# Altium footprint library PrISUm-ICs.PcbLib: 42 footprints (part 1 of 3)
Each footprint in its own frame and in the unit in brackets; x right, y up, seen from the top. Pads: shape width x height; smd on the part's side, far side on the other; paste and mask are expansions set on the pad; w line width, h text height; cw(c..) or ccw(c..) is an arc to the next point about the centre after c.
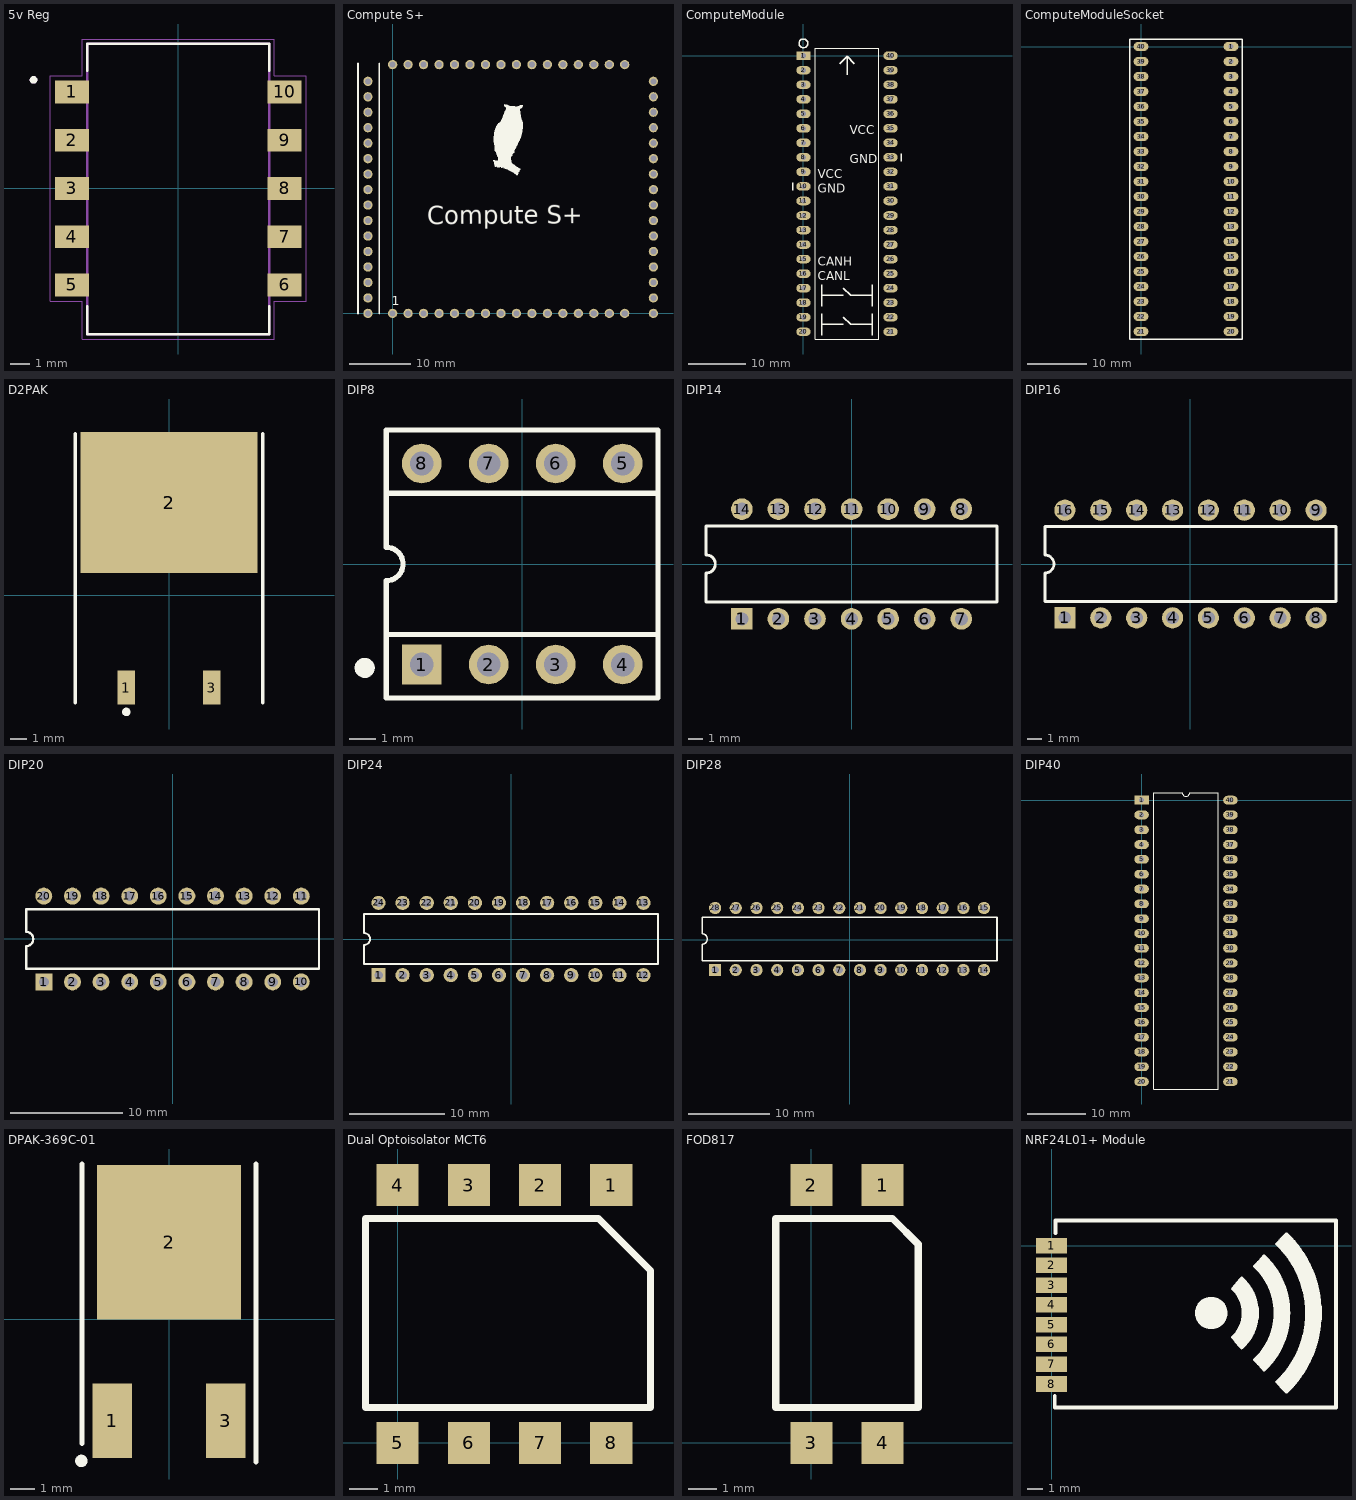
[diagram p0: the footprints below, top view; thin cyan lines are the x and y axes]

## 5v Reg [mm]
pads (10):
  rect 1.8x1.2 smd: 1(-5.6,5.08) 2(-5.6,2.54) 3(-5.6,0) 4(-5.6,-2.54) 5(-5.6,-5.08) 6(5.6,-5.08) 7(5.6,-2.54) 8(5.6,0) 9(5.6,2.54) 10(5.6,5.08)
Top Overlay:
  circle w0.2: c-7.62,5.715 r0.1
  lines w0.127: -4.8,-6.2 -4.8,-7.68 4.8,-7.68 4.8,-6.2 ; -4.8,6.2 -4.8,7.62 4.8,7.62 4.8,6.2
Mechanical 13:
  circle w0.2: c-7.62,5.715 r0.1
  lines w0.127: -4.8,-7.68 4.8,-7.68 4.8,7.62 -4.8,7.62 -4.8,-7.68
Mechanical 15:
  lines w0.05: -6.75,-5.93 -5.05,-5.93 -5.05,-7.93 5.05,-7.93 5.05,-5.93 6.75,-5.93 6.75,5.93 5.05,5.93 5.05,7.87 -5.05,7.87 -5.05,5.93 -6.75,5.93 -6.75,-5.93

## Compute S+ [mil]
height 346.46
pads (64):
  round 60 hole 39.37: CANH(1000,1607.95) CANL(1100,1607.95) GND(-160,900) GND(100,1607.95) GND(600,0) GND(900,1607.95) GND(1685,600) GND(1685,1400) PA00(-160,1500) PA01(-160,1400) PA02(-160,1300) PA03(-160,1200) PA04(-160,300) PA05(-160,200) PA06(-160,100) PA07(-160,0) PA08(0,0) PA09(100,0) PA10(200,0) PA11(300,0) PA12(1200,0) PA13(1300,0) PA14(1400,0) PA15(1500,0) PA16(1685,0) PA17(1685,100) PA18(1685,200) PA19(1685,300) PA20(1685,800) PA21(1685,900) PA22(1685,1000) PA23(1685,1100) PA24(1685,1200) PA25(1685,1300) PA27(1500,1607.95) PA28(1400,1607.95) PA30(1300,1607.95) PA31(1200,1607.95) PB00(500,1607.95) PB01(400,1607.95) PB02(300,1607.95) PB03(200,1607.95) PB04(-160,1100) PB05(-160,1000) PB06(-160,700) PB07(-160,600) PB08(-160,500) PB09(-160,400) PB10(400,0) PB11(500,0) PB12(800,0) PB13(900,0) PB14(1000,0) PB15(1100,0) PB16(1685,400) PB17(1685,500) PB30(700,1607.95) PB31(600,1607.95) VDD(-160,800) VDD(0,1607.95) VDD(700,0) VDD(800,1607.95) VDD(1685,700) VDD(1685,1500)
Top Overlay:
  drawing of 3 lines, arcs and shapes, not listed
  text "1" at -7.09,51.57 h60
  text "Compute S+" at 222.44,538.19 h196.85
3D body "V2_SP.step": height 549.33, standoff 19.68, extent -261.2,-83.86 1773.8,1726.14

## ComputeModule [mm] "Socket for compute module"
pads (40):
  rect 2.5x1.5 / inner rect 2.5x0.9 / far side rect 2.5x1.5 hole 0.9: 1(0,0)
  oval 2.5x1.5 / inner oval 2.5x0.9 / far side oval 2.5x1.5 hole 0.9: 2(0,-2.54) 3(0,-5.08) 4(0,-7.62) 5(0,-10.16) 6(0,-12.7) 7(0,-15.24) 8(0,-17.78) 9(0,-20.32) 10(0,-22.86) 11(0,-25.4) 12(0,-27.94) 13(0,-30.48) 14(0,-33.02) 15(0,-35.56) 16(0,-38.1) 17(0,-40.64) 18(0,-43.18) 19(0,-45.72) 20(0,-48.26) 21(15.24,-48.26) 22(15.24,-45.72) 23(15.24,-43.18) 24(15.24,-40.64) 25(15.24,-38.1) 26(15.24,-35.56) 27(15.24,-33.02) 28(15.24,-30.48) 29(15.24,-27.94) 30(15.24,-25.4) 31(15.24,-22.86) 32(15.24,-20.32) 33(15.24,-17.78) 34(15.24,-15.24) 35(15.24,-12.7) 36(15.24,-10.16) 37(15.24,-7.62) 38(15.24,-5.08) 39(15.24,-2.54) 40(15.24,0)
Top Overlay:
  circle w0.254: c0,2.159 r0.762
  lines w0.2: 2.085,-49.53 2.085,1.27 6.985,1.27 13.155,1.27 13.155,-49.53 2.085,-49.53
  lines w0.254: -1.905,-23.495 -1.905,-22.225 ; 3.175,-48.895 3.175,-45.085 ; 3.175,-46.99 6.35,-46.99 6.985,-46.99 ; 3.175,-43.815 3.175,-40.005 ; 3.175,-41.91 6.35,-41.91 6.985,-41.91 ; 6.35,-1.397 7.62,-0.127 ; 6.985,-45.72 8.255,-46.99 8.89,-46.99 12.065,-46.99 ; 6.985,-40.64 8.255,-41.91 8.89,-41.91 12.065,-41.91 ; 7.62,-3.302 7.62,-0.127 ; 8.89,-1.397 7.62,-0.127 ; 12.065,-48.895 12.065,-45.085 ; 12.065,-43.815 12.065,-40.005 ; 17.145,-18.415 17.145,-17.145
  text "CANH" at 2.54,-36.703 h1.52
  text "CANL" at 2.54,-39.243 h1.52
  text "GND" at 8.128,-18.796 h1.52
  text "VCC" at 8.128,-13.716 h1.52
  text "GND" at 2.54,-24.003 h1.52
  text "VCC" at 2.54,-21.463 h1.52
3D body "ComputeModule.step": height 17.95, standoff 2, extent -1.905,-49.53 17.145,9.961
3D body "Header Female 1x10.STEP": height 8.29, standoff -3.59, extent 14.035,-49.53 16.51,-23.53
3D body "Header Female 1x10.STEP": height 8.29, standoff -3.59, extent 14.035,-24.13 16.51,1.87
3D body "Header Female 1x10.STEP": height 8.29, standoff -3.59, extent -1.205,-49.53 1.27,-23.53
3D body "Header Female 1x10.STEP": height 8.29, standoff -3.59, extent -1.205,-24.13 1.27,1.87

## ComputeModuleSocket [mm] "Socket for compute module"
pads (40):
  oval 2.5x1.5 / inner oval 2.5x0.9 / far side oval 2.5x1.5 hole 0.9: 1(15.24,0) 2(15.24,-2.54) 3(15.24,-5.08) 4(15.24,-7.62) 5(15.24,-10.16) 6(15.24,-12.7) 7(15.24,-15.24) 8(15.24,-17.78) 9(15.24,-20.32) 10(15.24,-22.86) 11(15.24,-25.4) 12(15.24,-27.94) 13(15.24,-30.48) 14(15.24,-33.02) 15(15.24,-35.56) 16(15.24,-38.1) 17(15.24,-40.64) 18(15.24,-43.18) 19(15.24,-45.72) 20(15.24,-48.26) 21(0,-48.26) 22(0,-45.72) 23(0,-43.18) 24(0,-40.64) 25(0,-38.1) 26(0,-35.56) 27(0,-33.02) 28(0,-30.48) 29(0,-27.94) 30(0,-25.4) 31(0,-22.86) 32(0,-20.32) 33(0,-17.78) 34(0,-15.24) 35(0,-12.7) 36(0,-10.16) 37(0,-7.62) 38(0,-5.08) 39(0,-2.54) 40(0,0)
Top Overlay:
  lines w0.254: -1.905,-49.53 17.145,-49.53 17.145,1.27 2.085,1.27 -1.905,1.27 -1.905,-49.53
3D body "Pin Header 1x5 TH Pitch 2.54mm.stp": height 1.7, standoff -11, extent -1.27,-11.43 1.27,1.27
3D body "Pin Header 1x5 TH Pitch 2.54mm.stp": height 1.7, standoff -11, extent -1.27,-24.13 1.27,-11.43
3D body "Pin Header 1x5 TH Pitch 2.54mm.stp": height 1.7, standoff -11, extent -1.27,-36.83 1.27,-24.13
3D body "Pin Header 1x5 TH Pitch 2.54mm.stp": height 1.7, standoff -11, extent -1.27,-49.53 1.27,-36.83
3D body "Pin Header 1x5 TH Pitch 2.54mm.stp": height 1.7, standoff -11, extent 13.97,-36.83 16.51,-24.13
3D body "Pin Header 1x5 TH Pitch 2.54mm.stp": height 1.7, standoff -11, extent 13.97,-49.53 16.51,-36.83
3D body "Pin Header 1x5 TH Pitch 2.54mm.stp": height 1.7, standoff -11, extent 13.97,-24.13 16.51,-11.43
3D body "Pin Header 1x5 TH Pitch 2.54mm.stp": height 1.7, standoff -11, extent 13.97,-11.43 16.51,1.27

## D2PAK [mm]
pads (3):
  rect 1.05x2 smd: 1(-2.54,-5.5) 3(2.54,-5.5)
  rect 10.55x8.4 smd: 2(0,5.5)
Top Overlay:
  circle w0.25: c-2.54,-6.95 r0.125
  lines w0.2: -5.575,-6.4 -5.575,9.6 ; 5.575,-6.4 5.575,9.6

## DIP8 [mm]
pads (8):
  rect 1.5x1.5 hole 0.9: 1(-3.81,-3.81)
  round 1.5 hole 0.9: 2(-1.27,-3.81) 3(1.27,-3.81) 4(3.81,-3.81) 5(3.81,3.81) 6(1.27,3.81) 7(-1.27,3.81) 8(-3.81,3.81)
Top Overlay:
  circle w0.254: c-6.096,-3.937 r0.127
  circle w0.254: c-5.969,-3.937 r0.254
  lines w0.2: -5.15,-2.67 5.125,-2.67 ; -5.15,2.68 5.15,2.68 ; -5.15,-5.08 5.15,-5.08 5.15,5.08 -5.15,5.08 -5.15,0.635 cw(c-5.15,0) -5.15,-0.635 -5.15,-5.08
3D body "DIP8.STEP": height 3.85, standoff -2, extent -4.6,-3.935 4.6,3.935

## DIP14 [mm]
pads (14):
  rect 1.5x1.5 hole 0.9: 1(-7.62,-3.81)
  round 1.5 hole 0.9: 2(-5.08,-3.81) 3(-2.54,-3.81) 4(0,-3.81) 5(2.54,-3.81) 6(5.08,-3.81) 7(7.62,-3.81) 8(7.62,3.81) 9(5.08,3.81) 10(2.54,3.81) 11(0,3.81) 12(-2.54,3.81) 13(-5.08,3.81) 14(-7.62,3.81)
Top Overlay:
  lines w0.2: -10.1,-2.65 10.1,-2.65 10.1,2.65 -10.1,2.65 -10.1,0.635 cw(c-10.1,0) -10.1,-0.635 -10.1,-2.65

## DIP16 [mm]
pads (16):
  rect 1.5x1.5 hole 0.9: 1(-8.89,-3.81)
  round 1.5 hole 0.9: 2(-6.35,-3.81) 3(-3.81,-3.81) 4(-1.27,-3.81) 5(1.27,-3.81) 6(3.81,-3.81) 7(6.35,-3.81) 8(8.89,-3.81) 9(8.89,3.81) 10(6.35,3.81) 11(3.81,3.81) 12(1.27,3.81) 13(-1.27,3.81) 14(-3.81,3.81) 15(-6.35,3.81) 16(-8.89,3.81)
Top Overlay:
  lines w0.2: -10.3,-2.65 -10.3,-0.635 ccw(c-10.3,0) -10.3,0.635 -10.3,2.65 10.3,2.65 10.3,-2.65 -10.3,-2.65

## DIP20 [mm]
pads (20):
  rect 1.5x1.5 hole 0.9: 1(-11.43,-3.81)
  round 1.5 hole 0.9: 2(-8.89,-3.81) 3(-6.35,-3.81) 4(-3.81,-3.81) 5(-1.27,-3.81) 6(1.27,-3.81) 7(3.81,-3.81) 8(6.35,-3.81) 9(8.89,-3.81) 10(11.43,-3.81) 11(11.43,3.81) 12(8.89,3.81) 13(6.35,3.81) 14(3.81,3.81) 15(1.27,3.81) 16(-1.27,3.81) 17(-3.81,3.81) 18(-6.35,3.81) 19(-8.89,3.81) 20(-11.43,3.81)
Top Overlay:
  lines w0.2: -13,-2.65 -13,-0.635 ccw(c-13,0) -13,0.635 -13,2.65 13,2.65 13,-2.65 -13,-2.65

## DIP24 [mm]
pads (24):
  rect 1.5x1.5 hole 0.9: 1(-13.97,-3.81)
  round 1.5 hole 0.9: 2(-11.43,-3.81) 3(-8.89,-3.81) 4(-6.35,-3.81) 5(-3.81,-3.81) 6(-1.27,-3.81) 7(1.27,-3.81) 8(3.81,-3.81) 9(6.35,-3.81) 10(8.89,-3.81) 11(11.43,-3.81) 12(13.97,-3.81) 13(13.97,3.81) 14(11.43,3.81) 15(8.89,3.81) 16(6.35,3.81) 17(3.81,3.81) 18(1.27,3.81) 19(-1.27,3.81) 20(-3.81,3.81) 21(-6.35,3.81) 22(-8.89,3.81) 23(-11.43,3.81) 24(-13.97,3.81)
Top Overlay:
  lines w0.2: -15.5,-2.65 -15.5,-0.635 ccw(c-15.5,0) -15.5,0.635 -15.5,2.65 15.5,2.65 15.5,-2.65 -15.5,-2.65

## DIP28 [mm]
pads (28):
  rect 1.5x1.5 hole 0.9: 1(-16.51,-3.71)
  round 1.5 hole 0.9: 2(-13.97,-3.71) 3(-11.43,-3.71) 4(-8.89,-3.71) 5(-6.35,-3.71) 6(-3.81,-3.71) 7(-1.27,-3.71) 8(1.27,-3.71) 9(3.81,-3.71) 10(6.35,-3.71) 11(8.89,-3.71) 12(11.43,-3.71) 13(13.97,-3.71) 14(16.51,-3.71) 15(16.51,3.91) 16(13.97,3.91) 17(11.43,3.91) 18(8.89,3.91) 19(6.35,3.91) 20(3.81,3.91) 21(1.27,3.91) 22(-1.27,3.91) 23(-3.81,3.91) 24(-6.35,3.91) 25(-8.89,3.91) 26(-11.43,3.91) 27(-13.97,3.91) 28(-16.51,3.91)
Top Overlay:
  lines w0.2: -18.1,-2.55 18.1,-2.55 18.1,2.75 -18.1,2.75 -18.1,0.735 cw(c-18.1,0.1) -18.1,-0.535 -18.1,-2.55
3D body "DIP28.STEP": height 4.7, standoff -2.6, extent -17.6,-3.935 17.6,3.935

## DIP40 [mm]
pads (40):
  rect 2.5x1.5 / inner rect 2.5x0.9 / far side rect 2.5x1.5 hole 0.9: 1(0,0)
  oval 2.5x1.5 / inner oval 2.5x0.9 / far side oval 2.5x1.5 hole 0.9: 2(0,-2.54) 3(0,-5.08) 4(0,-7.62) 5(0,-10.16) 6(0,-12.7) 7(0,-15.24) 8(0,-17.78) 9(0,-20.32) 10(0,-22.86) 11(0,-25.4) 12(0,-27.94) 13(0,-30.48) 14(0,-33.02) 15(0,-35.56) 16(0,-38.1) 17(0,-40.64) 18(0,-43.18) 19(0,-45.72) 20(0,-48.26) 21(15.24,-48.26) 22(15.24,-45.72) 23(15.24,-43.18) 24(15.24,-40.64) 25(15.24,-38.1) 26(15.24,-35.56) 27(15.24,-33.02) 28(15.24,-30.48) 29(15.24,-27.94) 30(15.24,-25.4) 31(15.24,-22.86) 32(15.24,-20.32) 33(15.24,-17.78) 34(15.24,-15.24) 35(15.24,-12.7) 36(15.24,-10.16) 37(15.24,-7.62) 38(15.24,-5.08) 39(15.24,-2.54) 40(15.24,0)
Top Overlay:
  lines w0.2: 2.085,-49.53 2.085,1.27 6.985,1.27 ccw(c7.62,1.27) 8.255,1.27 13.155,1.27 13.155,-49.53 2.085,-49.53

## DPAK-369C-01 [mm] "For MTD6N20E N-Channel FET"
pads (3):
  rect 1.6x3 smd: 1(-2.286,-4.08) 3(2.286,-4.08)
  rect 5.8x6.2 smd: 2(0,3.1)
Top Overlay:
  circle w0.25: c-3.525,-5.7 r0.125
  lines w0.2: -3.5,-5 -3.5,6.25 ; 3.5,-5.75 3.5,6.25

## Dual Optoisolator MCT6 [mm]
pads (8):
  rect 1.5x1.5 smd: 1(7.62,9.2) 2(5.08,9.2) 3(2.54,9.2) 4(0,9.2) 5(0,0) 6(2.54,0) 7(5.08,0) 8(7.62,0)
Top Overlay:
  lines w0.254: -1.143,1.27 -1.143,8.001 7.163,8.001 9.017,6.147 9.017,1.27 -1.143,1.27

## FOD817 [mm] "Optoisolator"
height 3.85
pads (4):
  rect 1.5x1.5 smd: 1(2.54,9.2) 2(0,9.2) 3(0,0) 4(2.54,0)
Top Overlay:
  lines w0.254: -1.27,1.27 3.81,1.27 3.81,7.087 2.896,8.001 -1.27,8.001 -1.27,1.27

## NRF24L01+ Module [mm]
pads (8):
  rect 2x1 smd: 1(0,0) 2(0,-1.27) 3(0,-2.54) 4(0,-3.81) 5(0,-5.08) 6(0,-6.35) 7(0,-7.62) 8(0,-8.89)
Top Overlay:
  drawing of 792 lines, arcs and shapes, not listed